# Altium footprint library Libreria PCB.PcbLib: 96 footprints (part 6 of 6)
Each footprint in its own frame and in the unit in brackets; x right, y up, seen from the top. Pads: shape width x height; smd on the part's side, far side on the other; paste and mask are expansions set on the pad; w line width, h text height; cw(c..) or ccw(c..) is an arc to the next point about the centre after c.
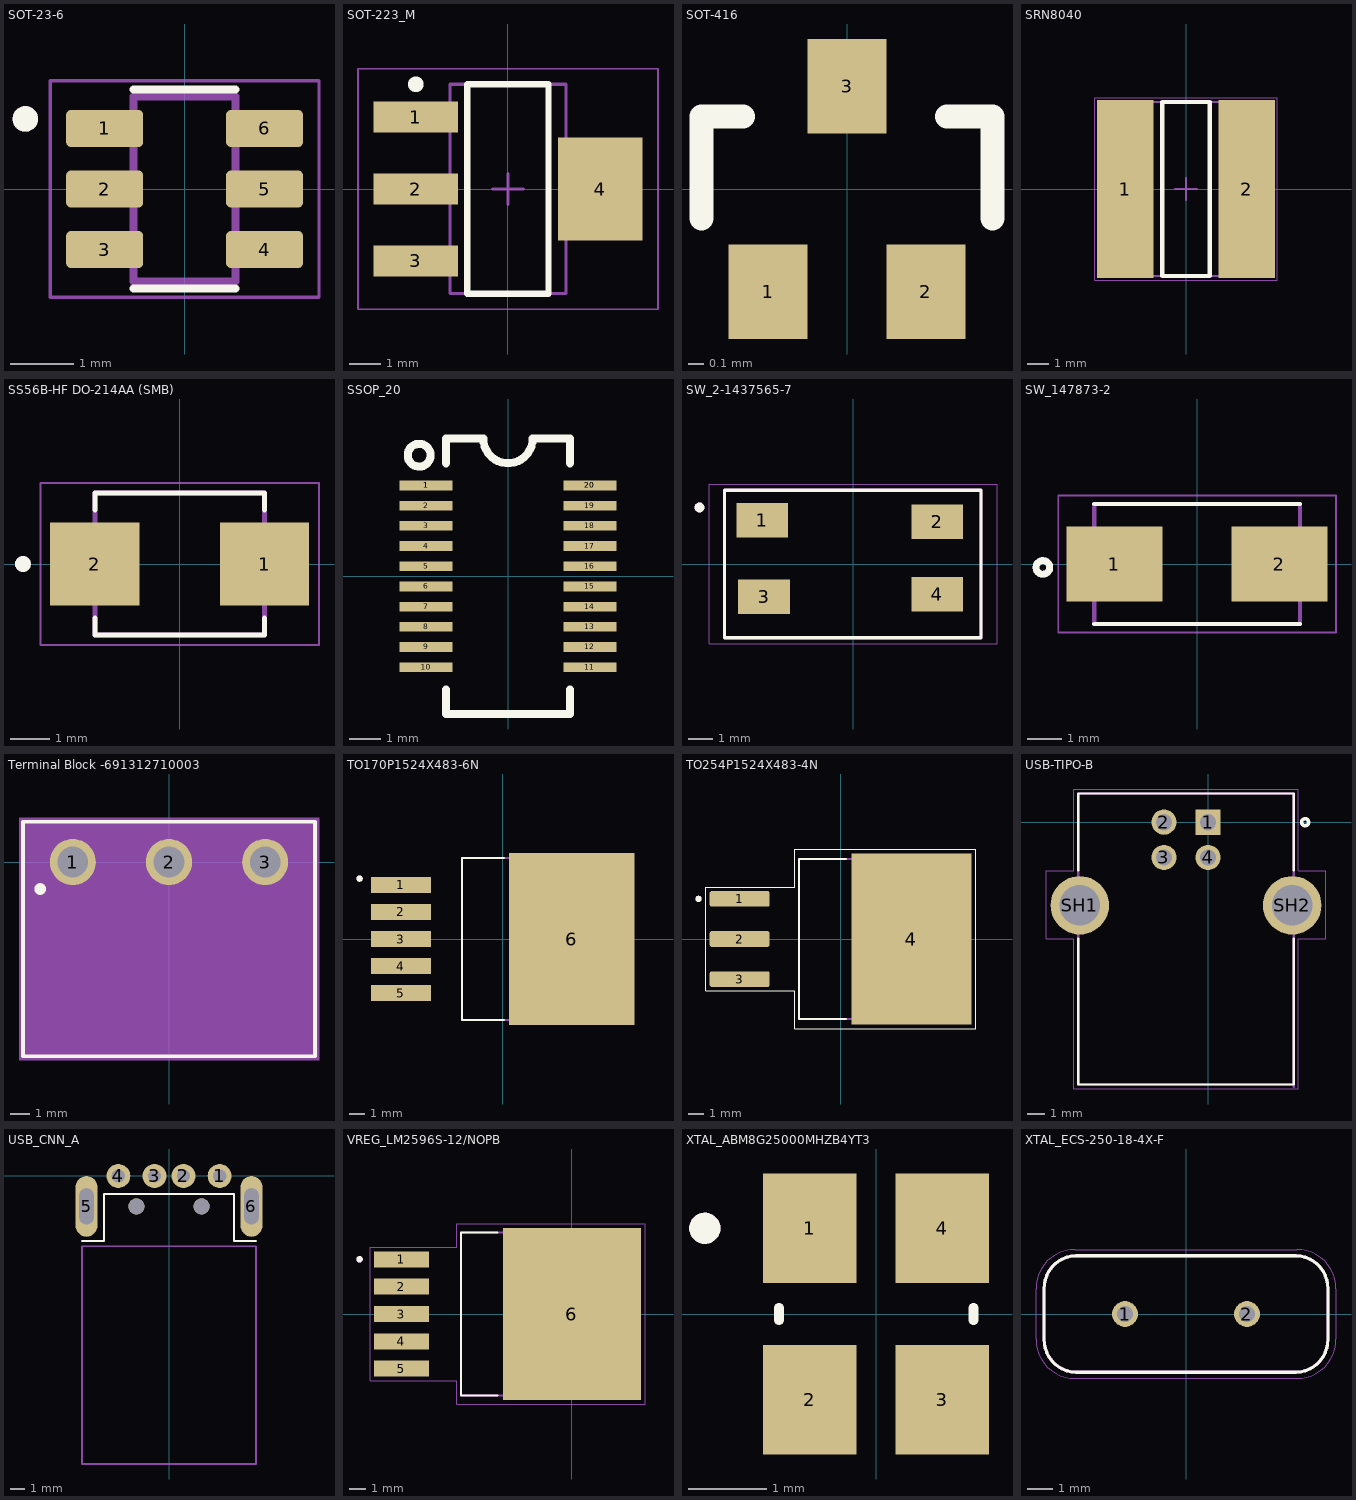
[diagram p5: the footprints below, top view; thin cyan lines are the x and y axes]

## SOT-23-6 [mm] "Pinza 11,4V 7A (8/20µs) Ipp Tvs Diodo Montaje en superficie"
pads (6):
  rrect25% 1.21x0.58 smd: 1(-1.255,0.95) 2(-1.255,0) 3(-1.255,-0.95) 4(1.255,-0.95) 5(1.255,0) 6(1.255,0.95)
Top Overlay:
  circle w0.2: c-2.5,1.1 r0.1
  lines w0.127: -0.8,-1.56 0.8,-1.56 ; -0.8,1.56 0.8,1.56
Mechanical 13:
  circle w0.2: c-2.5,1.1 r0.1
  lines w0.127: -0.8,-1.45 0.8,-1.45 0.8,1.45 -0.8,1.45 -0.8,-1.45
Mechanical 15:
  lines w0.05: -2.11,-1.7 -2.11,1.7 2.11,1.7 2.11,-1.7 -2.11,-1.7
3D body "SOT23-6-2.STEP": height 1.45, standoff 0, extent -1.4,-1.45 1.4,1.45

## SOT-223_M [mm] "SOT223, 4-Leads, Body 6.5x3.5mm, Pitch 2.3mm, Lead Span 7mm, IPC Low Density"
height 1.8
pads (4):
  rect 2.7x1 smd: 1(-2.95,2.3) 2(-2.95,0) 3(-2.95,-2.3)
  rect 2.7x3.3 smd: 4(2.95,0)
Top Overlay:
  circle w0.25: c-2.95,3.35 r0.125
  lines w0.2: -1.3,-3.35 -1.3,3.35 1.3,3.35 1.3,-3.35 -1.3,-3.35
Mechanical 13:
  lines w0.1: -1.85,-3.35 -1.85,3.35 1.85,3.35 1.85,-3.35 -1.85,-3.35
Mechanical 15:
  lines w0.05: -4.8,-3.85 -4.8,3.85 4.8,3.85 4.8,-3.85 -4.8,-3.85
  lines w0.1: -0.5,0 0.5,0 ; 0,-0.5 0,0.5
3D body: height 1.8, standoff 0.02, extent -1.85,-3.35 1.85,3.35

## SOT-416 [mm]
pads (3):
  rect 0.5x0.6 smd: 1(-0.5,-0.65) 2(0.5,-0.65) 3(0,0.65)
Top Overlay:
  lines w0.152: -0.922,-0.185 -0.922,0.46 -0.658,0.46 ; 0.633,0.46 0.922,0.46 0.922,-0.185
3D body "SOT-416.STEP": height 0.78, standoff -0.02, extent -0.8,-0.8 0.8,0.8

## SRN8040 [mm] "Inductor"
pads (2):
  rect 2.6x8.2 smd: 1(-2.8,0) 2(2.8,0)
Top Overlay:
  lines w0.2: -1.1,-4 -1.1,4 1.1,4 1.1,-4 -1.1,-4
Mechanical 13:
  lines w0.1: -4,-4 4,-4 4,4 -4,4 -4,-4
Mechanical 15:
  lines w0.05: 4.2,4.2 4.2,-4.2 -4.2,-4.2 -4.2,4.2 4.2,4.2 ; 4.2,4.2 4.2,4.2
  lines w0.1: -0.5,0 0.5,0 ; 0,-0.5 0,0.5
3D body "User Library-Inductor SRN8040 Series.STEP": height 4, standoff 0, extent -4.009,-4 4.009,4

## SS56B-HF DO-214AA (SMB) [mm] "Diodo Schottky 60 V 5A Montaje en superficie DO-214AA (SMB)"
pads (2):
  rect 2.28x2.12 smd: 1(2.165,0) 2(-2.165,0)
Top Overlay:
  circle w0.2: c-4,0 r0.1
  lines w0.127: -2.163,-1.38 -2.163,-1.813 2.163,-1.813 2.163,-1.38 ; -2.163,1.38 -2.163,1.813 2.163,1.813 2.163,1.38
Mechanical 13:
  circle w0.2: c-4,0 r0.1
  lines w0.127: -2.163,-1.813 2.163,-1.813 2.163,1.813 -2.163,1.813 -2.163,-1.813
Mechanical 15:
  lines w0.05: -3.555,-2.063 3.555,-2.063 3.555,2.063 -3.555,2.063 -3.555,-2.063
3D body "User Library-Diode Molded Body.STEP": height 2.28, standoff -0.03, extent -2.5,-1.35 2.5,1.35

## SSOP_20 [mil]
pads (22):
  rect 66x12 smd: 1(-101.5,112.5) 1(-101.5,112.5) 2(-101.5,87.5) 3(-101.5,62.5) 4(-101.5,37.5) 5(-101.5,12.5) 6(-101.5,-12.5) 7(-101.5,-37.5) 8(-101.5,-62.5) 9(-101.5,-87.5) 10(-101.5,-112.5) 11(101.5,-112.5) 12(101.5,-87.5) 13(101.5,-62.5) 14(101.5,-37.5) 15(101.5,-12.5) 16(101.5,12.5) 17(101.5,37.5) 18(101.5,62.5) 19(101.5,87.5) 20(101.5,112.5) 20(101.5,112.5)
Top Overlay:
  circle w10: c-110,150 r14.14
  lines w10: -76.99,-140 -76.99,-170.5 77.01,-170.5 77.01,-140 ; -76.99,140 -76.99,170.5 -30.51,170.51 ccw(c0,170.51) 30.51,170.51 77,170.51 77.01,140

## SW_2-1437565-7 [mm]
pads (4):
  rect 2.1x1.4 smd: 1(-3.7,1.775) 2(3.425,1.725) 3(-3.625,-1.325) 4(3.425,-1.225)
Top Overlay:
  circle w0.2: c-6.25,2.3 r0.1
  lines w0.127: -5.225,-3 -5.225,3 5.2,3 5.2,-3 -5.225,-3
Mechanical 13:
  circle w0.2: c-6.25,2.3 r0.1
  lines w0.127: -5.225,-3 5.2,-3 5.2,3 -5.225,3 -5.225,-3
Mechanical 15:
  lines w0.05: -5.85,-3.25 5.85,-3.25 5.85,3.25 -5.85,3.25 -5.85,-3.25
3D body "SW4_5x4_5x5.STEP": height 5, standoff -0.1, extent -3.425,-2.025 3.375,2.475

## SW_147873-2 [mm]
pads (2):
  rect 2.8x2.2 smd: 1(-2.413,0) 2(2.4,0)
Top Overlay:
  circle w0.2: c-4.5,-0.1 r0.2
  lines w0.127: -3,-1.75 3,-1.75 ; -3,1.75 3,1.75
Mechanical 13:
  circle w0.2: c-4.5,-0.1 r0.2
  lines w0.127: -3,-1.75 -3,1.75 3,1.75 3,-1.75 -3,-1.75
Mechanical 15:
  lines w0.05: -4.05,-2 4.05,-2 4.05,2 -4.05,2 -4.05,-2
3D body "147873-2.stp": height 4.61, standoff 0.11, extent -3.527,-2.103 3.273,1.397

## Terminal Block -691312710003 [mm] "3 Position Terminal Block Header, Male Pins, Shrouded (2 Side) 0.197\" (5.00mm) 90°, Right Angle - Through Hole"
pads (3):
  round 2.4 hole 1.6: 1(-5,0) 2(0,0) 3(5,0)
Top Overlay:
  circle w0.4: c-6.7,-1.4 r0.1
  lines w0.2: -7.6,-10.1 -7.6,2.1 7.6,2.1 7.6,-10.1 -7.6,-10.1
Mechanical 13:
  lines w0.1: -7.5,-10 7.5,-10 7.5,2 -7.5,2 -7.5,-10
Mechanical 15:
  region: 7.8,-10.3 -7.8,-10.3 -7.8,2.3 7.8,2.3
3D body "2305909-3.stp": height 15.5, standoff 0.5, extent -7.5,-19.2 7.5,-0.8
3D body "691312710003.stp": height 8.55, standoff -3.45, extent -7.5,-10 7.5,2

## TO170P1524X483-6N [mm]
height 4.83
pads (6):
  rect 3.79x0.99 smd: 1(-6.4,3.4) 2(-6.4,1.7) 3(-6.4,0) 4(-6.4,-1.7) 5(-6.4,-3.4)
  rect 7.88x10.84 smd paste-6: 6(4.35,0)
Top Overlay:
  circle w0.2: c-9,3.8 r0.1
  lines w0.127: 0.09,-5.08 -2.553,-5.08 -2.553,5.08 0.09,5.08
Top Paste:
  region: 7.74,-5.15 6.22,-5.15 6.22,-3.9 7.74,-3.9
  region: 2.48,-5.15 0.96,-5.15 0.96,-3.9 2.48,-3.9
  region: 5.11,-5.15 3.59,-5.15 3.59,-3.9 5.11,-3.9
  region: 7.74,-3.34 6.22,-3.34 6.22,-2.09 7.74,-2.09
  region: 2.48,-3.34 0.96,-3.34 0.96,-2.09 2.48,-2.09
  region: 5.11,-3.34 3.59,-3.34 3.59,-2.09 5.11,-2.09
  region: 7.74,-1.53 6.22,-1.53 6.22,-0.28 7.74,-0.28
  region: 2.48,-1.53 0.96,-1.53 0.96,-0.28 2.48,-0.28
  region: 5.11,-1.53 3.59,-1.53 3.59,-0.28 5.11,-0.28
  region: 7.74,3.9 6.22,3.9 6.22,5.15 7.74,5.15
  region: 2.48,3.9 0.96,3.9 0.96,5.15 2.48,5.15
  region: 5.11,3.9 3.59,3.9 3.59,5.15 5.11,5.15
  region: 7.74,2.09 6.22,2.09 6.22,3.34 7.74,3.34
  region: 2.48,2.09 0.96,2.09 0.96,3.34 2.48,3.34
  region: 5.11,2.09 3.59,2.09 3.59,3.34 5.11,3.34
  region: 7.74,0.28 6.22,0.28 6.22,1.53 7.74,1.53
  region: 2.48,0.28 0.96,0.28 0.96,1.53 2.48,1.53
  region: 5.11,0.28 3.59,0.28 3.59,1.53 5.11,1.53
Mechanical 13:
  circle w0.2: c-9,3.8 r0.1
  lines w0.127: -2.553,-5.08 -2.553,5.08 6.368,5.08 6.368,-5.08 -2.553,-5.08
3D body "step_temp.STEP": height 4.65, standoff -0.15, extent -7.175,-5.08 7.175,5.08

## TO254P1524X483-4N [mm]
pads (4):
  rrect25% 3.79x0.99 smd: 1(-6.4,2.54) 2(-6.4,0) 3(-6.4,-2.54)
  rect 7.62x10.84 smd paste-6: 4(4.48,0)
Top Overlay:
  circle w0.2: c-9,2.54 r0.1
  lines w0.05: -8.545,-3.285 -2.898,-3.285 -2.898,-5.67 8.54,-5.67 8.54,5.67 -2.898,5.67 -2.898,3.285 -8.545,3.285 -8.545,-3.285
  lines w0.127: 0.35,-5.08 -2.648,-5.08 -2.648,5.08 0.35,5.08
Top Paste:
  region: 5.205,0.27 3.755,0.27 3.755,1.53 5.205,1.53
  region: 5.205,2.07 3.755,2.07 3.755,3.33 5.205,3.33
  region: 5.205,3.87 3.755,3.87 3.755,5.13 5.205,5.13
  region: 5.205,-1.53 3.755,-1.53 3.755,-0.27 5.205,-0.27
  region: 5.205,-3.33 3.755,-3.33 3.755,-2.07 5.205,-2.07
  region: 5.205,-5.13 3.755,-5.13 3.755,-3.87 5.205,-3.87
  region: 7.745,0.27 6.295,0.27 6.295,1.53 7.745,1.53
  region: 7.745,2.07 6.295,2.07 6.295,3.33 7.745,3.33
  region: 7.745,3.87 6.295,3.87 6.295,5.13 7.745,5.13
  region: 7.745,-1.53 6.295,-1.53 6.295,-0.27 7.745,-0.27
  region: 7.745,-3.33 6.295,-3.33 6.295,-2.07 7.745,-2.07
  region: 7.745,-5.13 6.295,-5.13 6.295,-3.87 7.745,-3.87
  region: 2.665,0.27 1.215,0.27 1.215,1.53 2.665,1.53
  region: 2.665,2.07 1.215,2.07 1.215,3.33 2.665,3.33
  region: 2.665,3.87 1.215,3.87 1.215,5.13 2.665,5.13
  region: 2.665,-1.53 1.215,-1.53 1.215,-0.27 2.665,-0.27
  region: 2.665,-3.33 1.215,-3.33 1.215,-2.07 2.665,-2.07
  region: 2.665,-5.13 1.215,-5.13 1.215,-3.87 2.665,-3.87
Mechanical 13:
  circle w0.2: c-9,2.54 r0.1
  lines w0.127: -2.648,-5.08 6.373,-5.08 6.373,5.08 -2.648,5.08 -2.648,-5.08
3D body "LM7812S_NOPB.STEP": height 4.65, standoff -0.15, extent -7.302,-5.08 7.049,5.08

## USB-TIPO-B [mm] "Tipo B, USB 2.0, 1 A, ángulo recto, orificio pasante, receptáculo USB"
pads (6):
  rect 1.428x1.428 hole 0.92: 1(0,0)
  round 1.428 hole 0.92: 2(-2.5,0) 3(-2.5,-2) 4(0,-2)
  round 3.316 hole 2.3: SH1(-7.27,-4.71) SH2(4.77,-4.71)
Top Overlay:
  circle w0.2: c5.5,0 r0.2
  lines w0.127: -7.35,-6.61 -7.35,-14.87 4.85,-14.87 4.85,-6.61 ; -7.35,-2.74 -7.35,1.63 4.85,1.63 4.85,-2.74
Mechanical 13:
  circle w0.4: c0,0 r0.2
  lines w0.127: 4.85,-14.99 4.85,-14.87 ; 4.85,-14.87 4.85,1.63 -7.35,1.63 -7.35,-14.87 4.85,-14.87
Mechanical 15:
  lines w0.05: -9.17,-6.61 -7.6,-6.61 -7.6,-15.12 5.1,-15.12 5.1,-6.62 6.67,-6.62 6.67,-2.74 5.1,-2.74 5.1,1.88 -7.6,1.88 -7.6,-2.74 -9.17,-2.74 -9.17,-6.61
3D body "USB-B (Molex).STEP": height 11, standoff -2.8, extent -7.25,-15 4.75,2

## USB_CNN_A [mm] "Usb connector - A Type Plug R/A Connector (DIP)"
pads (8):
  round 1.656 hole 0.92: 1(3.5,0) 2(1,0) 3(-1,0) 4(-3.5,0)
  oval 1.5x4.2 hole 1 slot 2.5 at 90 deg: 5(-5.7,-2.1) 6(5.7,-2.1)
  round 1.1 hole 1.1 unplated: ""(-2.25,-2.1) ""(2.25,-2.1)
Top Overlay:
  lines w0.127: -6,-4.5 -4.5,-4.5 -4.5,-1.25 4.5,-1.25 4.5,-4.5 6,-4.5
Mechanical 4:
  lines w0.127: -6,-19.9 -6,-4.85 6,-4.85 6,-19.9 -6,-19.9

## VREG_LM2596S-12/NOPB [mm]
pads (6):
  rect 3.4x1 smd paste-3 mask+0: 1(-10.6,3.4) 2(-10.6,1.7) 3(-10.6,0) 4(-10.6,-1.7) 5(-10.6,-3.4)
  rect 8.6x10.7 smd paste-6 mask+0: 6(0,0)
Top Overlay:
  circle w0.2: c-13.2,3.4 r0.1
  lines w0.127: -4.62,-5.08 -6.905,-5.08 -6.905,5.08 -4.62,5.08
Top Paste:
  region: 4.25,-5.3 -4.25,-5.3 -4.25,5.3 4.25,5.3
  region: -8.95,-0.45 -12.25,-0.45 -12.25,0.45 -8.95,0.45
  region: -8.95,1.25 -12.25,1.25 -12.25,2.15 -8.95,2.15
  region: -8.95,2.95 -12.25,2.95 -12.25,3.85 -8.95,3.85
  region: -8.95,-2.15 -12.25,-2.15 -12.25,-1.25 -8.95,-1.25
  region: -8.95,-3.85 -12.25,-3.85 -12.25,-2.95 -8.95,-2.95
Top Solder:
  region: 4.37,-5.42 -4.37,-5.42 -4.37,5.42 4.37,5.42
  region: -8.83,-0.57 -12.37,-0.57 -12.37,0.57 -8.83,0.57
  region: -8.83,1.13 -12.37,1.13 -12.37,2.27 -8.83,2.27
  region: -8.83,2.83 -12.37,2.83 -12.37,3.97 -8.83,3.97
  region: -8.83,-2.27 -12.37,-2.27 -12.37,-1.13 -8.83,-1.13
  region: -8.83,-3.97 -12.37,-3.97 -12.37,-2.83 -8.83,-2.83
Mechanical 13:
  circle w0.2: c-13.2,3.4 r0.1
  lines w0.127: -6.905,-5.08 -6.905,5.08 2.02,5.08 2.02,-5.08 -6.905,-5.08
Mechanical 15:
  lines w0.05: -12.55,-4.15 -7.155,-4.15 -7.155,-5.6 4.55,-5.6 4.55,5.6 -7.155,5.6 -7.155,4.15 -12.55,4.15 -12.55,-4.15
3D body "TO-263-5-LM2596S.STEP": height 4.65, standoff -0.15, extent -11.366,-5.08 2.985,5.08

## XTAL_ABM8G25000MHZB4YT3 [mm]
height 1
pads (4):
  rect 1.2x1.4 smd: 1(-0.85,1.1) 2(-0.85,-1.1) 3(0.85,-1.1) 4(0.85,1.1)
Top Overlay:
  circle w0.2: c-2.2,1.1 r0.1
  lines w0.127: -1.25,-0.08 -1.25,0.08 ; 1.25,-0.08 1.25,0.08
Mechanical 13:
  circle w0.2: c-2.2,1.1 r0.1
3D body "step_temp.STEP": height 0.99, standoff 0, extent -1.6,-1.245 1.6,1.245

## XTAL_ECS-250-18-4X-F [mm]
pads (2):
  round 1.03 hole 0.63: 1(-2.44,0) 2(2.44,0)
Top Overlay:
  lines w0.127: -5.675,-1.012 ccw(c-4.38,-1.035) -4.403,-2.33 ; -5.675,-1.01 -5.675,1.01 ; -5.675,1.012 cw(c-4.38,1.035) -4.403,2.33 ; -4.405,-2.33 4.405,-2.33 ; -4.405,2.33 4.405,2.33 ; 4.403,-2.33 ccw(c4.38,-1.035) 5.675,-1.012 ; 4.403,2.33 cw(c4.38,1.035) 5.675,1.012 ; 5.675,-1.01 5.675,1.01
Mechanical 13:
  lines w0.127: -5.675,-1.012 ccw(c-4.38,-1.035) -4.403,-2.33 ; -5.675,-1.01 -5.675,1.01 ; -5.675,1.012 cw(c-4.38,1.035) -4.403,2.33 ; -4.405,-2.33 4.405,-2.33 ; -4.405,2.33 4.405,2.33 ; 4.403,-2.33 ccw(c4.38,-1.035) 5.675,-1.012 ; 4.403,2.33 cw(c4.38,1.035) 5.675,1.012 ; 5.675,-1.01 5.675,1.01
Mechanical 15:
  lines w0.05: -6,-1.01 ccw(c-4.43,-1.01) -4.43,-2.58 4.43,-2.58 ccw(c4.43,-1.01) 6,-1.01 6,1.01 ccw(c4.43,1.01) 4.43,2.58 -4.43,2.58 ccw(c-4.43,1.01) -6,1.01 -6,-1.01
3D body "step_temp.STEP": height 3.5, standoff -12.7, extent -5.675,-2.325 5.675,2.325